# Altium footprint library BARKO_PCBLIB.PcbLib: 531 footprints (part 26 of 34)
Each footprint in its own frame and in the unit in brackets; x right, y up, seen from the top. Pads: shape width x height; smd on the part's side, far side on the other; paste and mask are expansions set on the pad; w line width, h text height; cw(c..) or ccw(c..) is an arc to the next point about the centre after c.
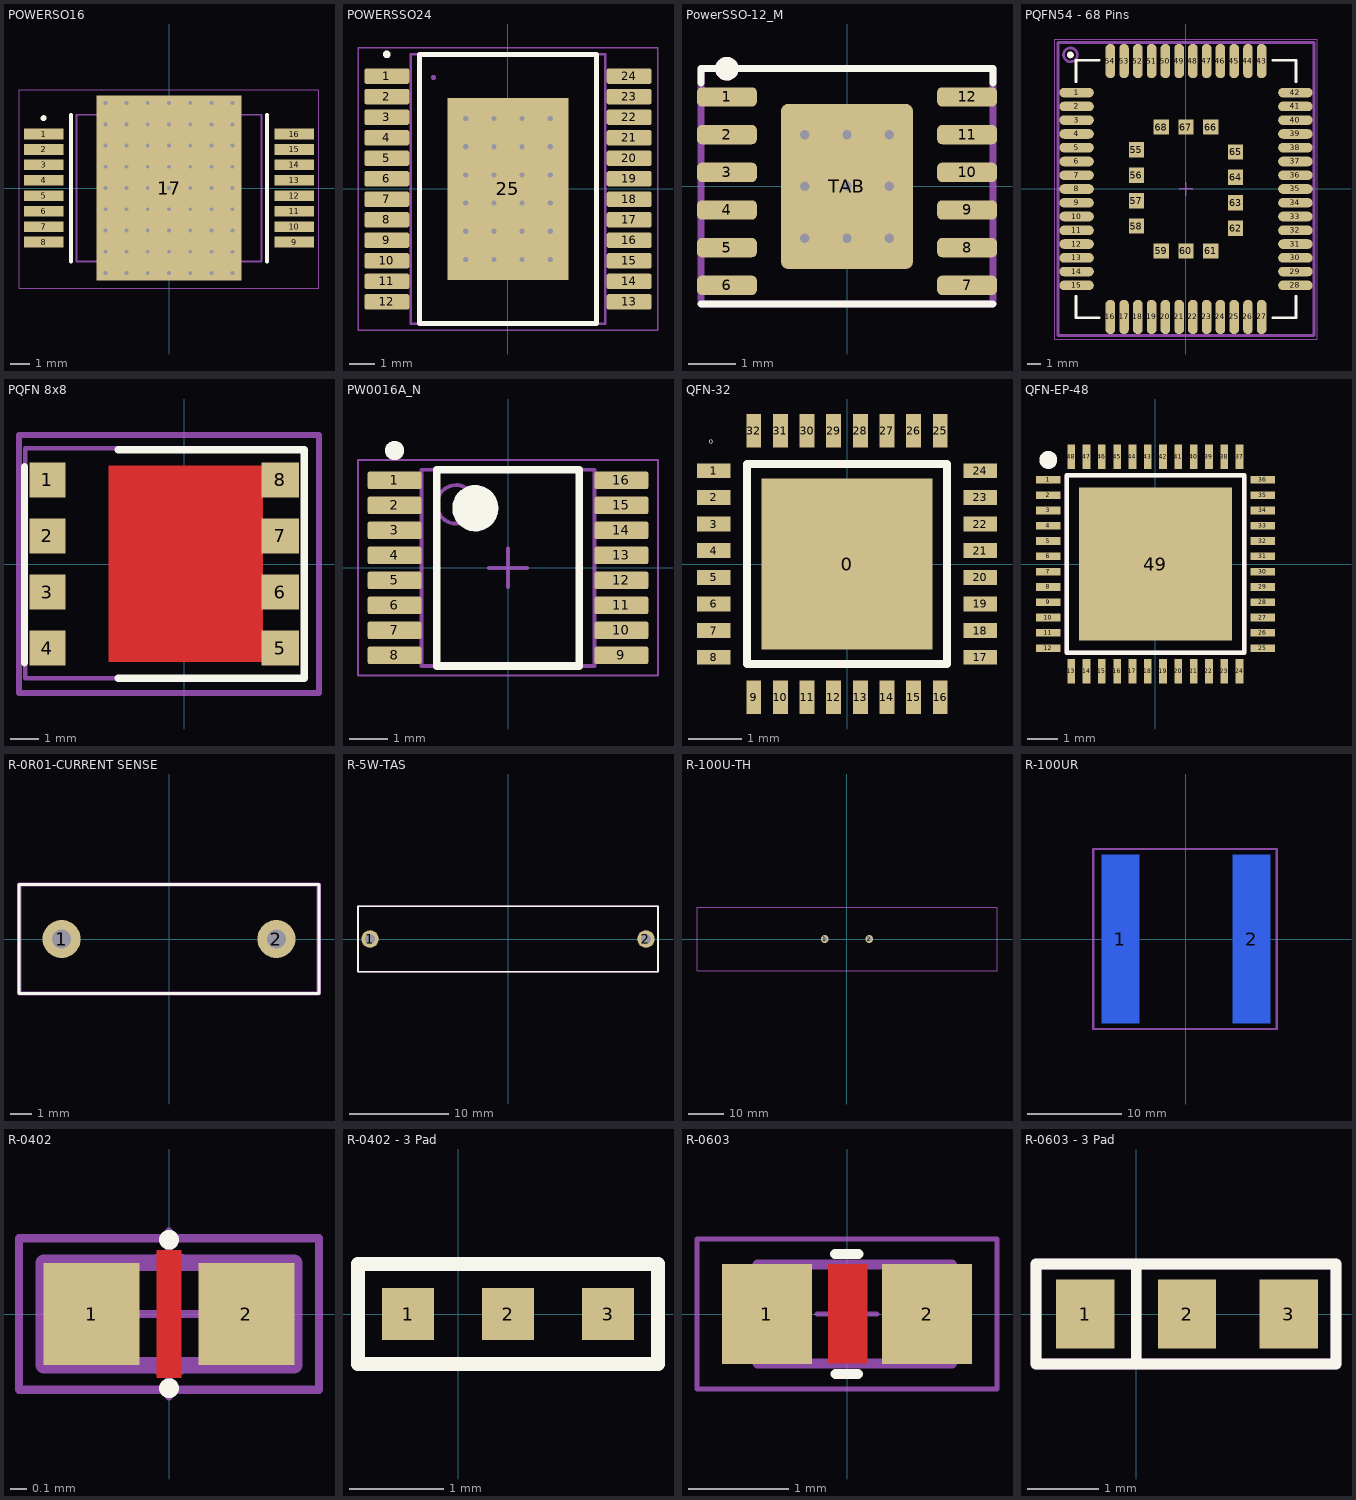
[diagram p25: the footprints below, top view; thin cyan lines are the x and y axes]

## POWERSO16 [mm] "SOP, 16-Leads, Body 7.50x9.45mm, Pitch 0.80mm, Thermal Pad 9.60x7.50mm, IPC Medium Density"
height 3.6
pads (17):
  rect 2.05x0.55 smd mask+0.05: 1(-6.5,2.8) 2(-6.5,2) 3(-6.5,1.2) 4(-6.5,0.4) 5(-6.5,-0.4) 6(-6.5,-1.2) 7(-6.5,-2) 8(-6.5,-2.8) 9(6.5,-2.8) 10(6.5,-2) 11(6.5,-1.2) 12(6.5,-0.4) 13(6.5,0.4) 14(6.5,1.2) 15(6.5,2) 16(6.5,2.8)
  rect 7.5x9.6 smd paste-10 mask+0.05: 17(0,0)
via 3.3,-4.4 diameter 0.5 hole 0.2
via 2.2,-4.4 diameter 0.5 hole 0.2
via 1.1,-4.4 diameter 0.5 hole 0.2
via 0,-4.4 diameter 0.5 hole 0.2
via -1.1,-4.4 diameter 0.5 hole 0.2
via -2.2,-4.4 diameter 0.5 hole 0.2
via -3.3,-4.4 diameter 0.5 hole 0.2
via 3.3,-3.3 diameter 0.5 hole 0.2
via 2.2,-3.3 diameter 0.5 hole 0.2
via 1.1,-3.3 diameter 0.5 hole 0.2
via 0,-3.3 diameter 0.5 hole 0.2
via -1.1,-3.3 diameter 0.5 hole 0.2
via -2.2,-3.3 diameter 0.5 hole 0.2
via -3.3,-3.3 diameter 0.5 hole 0.2
via 3.3,-2.2 diameter 0.5 hole 0.2
via 2.2,-2.2 diameter 0.5 hole 0.2
via 1.1,-2.2 diameter 0.5 hole 0.2
via 0,-2.2 diameter 0.5 hole 0.2
via -1.1,-2.2 diameter 0.5 hole 0.2
via -2.2,-2.2 diameter 0.5 hole 0.2
via -3.3,-2.2 diameter 0.5 hole 0.2
via 3.3,-1.1 diameter 0.5 hole 0.2
via 2.2,-1.1 diameter 0.5 hole 0.2
via 1.1,-1.1 diameter 0.5 hole 0.2
via 0,-1.1 diameter 0.5 hole 0.2
via -1.1,-1.1 diameter 0.5 hole 0.2
via -2.2,-1.1 diameter 0.5 hole 0.2
via -3.3,-1.1 diameter 0.5 hole 0.2
via 3.3,0 diameter 0.5 hole 0.2
via 2.2,0 diameter 0.5 hole 0.2
via 1.1,0 diameter 0.5 hole 0.2
via 0,0 diameter 0.5 hole 0.2
via -1.1,0 diameter 0.5 hole 0.2
via -2.2,0 diameter 0.5 hole 0.2
via -3.3,0 diameter 0.5 hole 0.2
via 3.3,1.1 diameter 0.5 hole 0.2
via 2.2,1.1 diameter 0.5 hole 0.2
via 1.1,1.1 diameter 0.5 hole 0.2
via 0,1.1 diameter 0.5 hole 0.2
via -1.1,1.1 diameter 0.5 hole 0.2
via -2.2,1.1 diameter 0.5 hole 0.2
via -3.3,1.1 diameter 0.5 hole 0.2
via 3.3,2.2 diameter 0.5 hole 0.2
via 2.2,2.2 diameter 0.5 hole 0.2
via 1.1,2.2 diameter 0.5 hole 0.2
via 0,2.2 diameter 0.5 hole 0.2
via -1.1,2.2 diameter 0.5 hole 0.2
via -2.2,2.2 diameter 0.5 hole 0.2
via -3.3,2.2 diameter 0.5 hole 0.2
via 3.3,3.3 diameter 0.5 hole 0.2
via 2.2,3.3 diameter 0.5 hole 0.2
via 1.1,3.3 diameter 0.5 hole 0.2
via 0,3.3 diameter 0.5 hole 0.2
via -1.1,3.3 diameter 0.5 hole 0.2
via -2.2,3.3 diameter 0.5 hole 0.2
via -3.3,3.3 diameter 0.5 hole 0.2
via 3.3,4.4 diameter 0.5 hole 0.2
via 2.2,4.4 diameter 0.5 hole 0.2
via 1.1,4.4 diameter 0.5 hole 0.2
via 0,4.4 diameter 0.5 hole 0.2
via -1.1,4.4 diameter 0.5 hole 0.2
via -2.2,4.4 diameter 0.5 hole 0.2
via -3.3,4.4 diameter 0.5 hole 0.2
Top Overlay:
  circle w0.2: c-6.5,3.625 r0.05
  lines w0.2: -5.075,-3.8 -5.075,3.8 ; 5.075,-3.8 5.075,3.8
Top Paste:
  rectangle: -3.1,3.5 -2.4,4.2
  rectangle: -2,3.5 -1.3,4.2
  rectangle: -0.9,3.5 -0.2,4.2
  rectangle: 0.2,3.5 0.9,4.2
  rectangle: 1.3,3.5 2,4.2
  rectangle: 2.4,3.5 3.1,4.2
  rectangle: 2.4,2.4 3.1,3.1
  rectangle: 1.3,2.4 2,3.1
  rectangle: 0.2,2.4 0.9,3.1
  rectangle: -0.9,2.4 -0.2,3.1
  rectangle: -2,2.4 -1.3,3.1
  rectangle: -3.1,2.4 -2.4,3.1
  rectangle: 2.4,1.3 3.1,2
  rectangle: 1.3,1.3 2,2
  rectangle: 0.2,1.3 0.9,2
  rectangle: -0.9,1.3 -0.2,2
  rectangle: -2,1.3 -1.3,2
  rectangle: -3.1,1.3 -2.4,2
  rectangle: -3.1,-2 -2.4,-1.3
  rectangle: -2,-2 -1.3,-1.3
  rectangle: -0.9,-2 -0.2,-1.3
  rectangle: 0.2,-2 0.9,-1.3
  rectangle: 1.3,-2 2,-1.3
  rectangle: 2.4,-2 3.1,-1.3
  rectangle: -3.1,-0.9 -2.4,-0.2
  rectangle: -2,-0.9 -1.3,-0.2
  rectangle: -0.9,-0.9 -0.2,-0.2
  rectangle: 0.2,-0.9 0.9,-0.2
  rectangle: 1.3,-0.9 2,-0.2
  rectangle: 2.4,-0.9 3.1,-0.2
  rectangle: 2.4,0.2 3.1,0.9
  rectangle: 1.3,0.2 2,0.9
  rectangle: 0.2,0.2 0.9,0.9
  rectangle: -0.9,0.2 -0.2,0.9
  rectangle: -2,0.2 -1.3,0.9
  rectangle: -3.1,0.2 -2.4,0.9
  rectangle: 2.4,-3.1 3.1,-2.4
  rectangle: 1.3,-3.1 2,-2.4
  rectangle: 0.2,-3.1 0.9,-2.4
  rectangle: -0.9,-3.1 -0.2,-2.4
  rectangle: -2,-3.1 -1.3,-2.4
  rectangle: -3.1,-3.1 -2.4,-2.4
  rectangle: 2.4,-4.2 3.1,-3.5
  rectangle: 1.3,-4.2 2,-3.5
  rectangle: 0.2,-4.2 0.9,-3.5
  rectangle: -0.9,-4.2 -0.2,-3.5
  rectangle: -2,-4.2 -1.3,-3.5
  rectangle: -3.1,-4.2 -2.4,-3.5
Mechanical 15:
  lines w0.05: -7.775,-5.2 7.775,-5.2 7.775,5.1 -7.775,5.1 -7.775,-5.2
  lines w0.1: -0.5,0 0.5,0 ; 0,-0.5 0,0.5
ASM Top:
  lines w0.1: -4.8,-3.8 4.8,-3.8 4.8,3.8 -4.8,3.8 -4.8,-3.8
  text ".designator" at -0.344,0 h0.8
3D body "VND5T016ASPTR-E.stp": height 3.6, standoff 0, extent -7.05,-4.75 7.05,4.75

## POWERSSO24 [mm] "SOP, 24-Leads, Body 10.30x7.50mm, Pitch 0.80mm, Thermal Pad 7.10x4.70mm, IPC Medium Density"
height 2.45
pads (25):
  rrect25% 1.75x0.6 smd paste-0.05 mask+0.05: 1(-4.725,4.4) 2(-4.725,3.6) 3(-4.725,2.8) 4(-4.725,2) 5(-4.725,1.2) 6(-4.725,0.4) 7(-4.725,-0.4) 8(-4.725,-1.2) 9(-4.725,-2) 10(-4.725,-2.8) 11(-4.725,-3.6) 12(-4.725,-4.4) 13(4.725,-4.4) 14(4.725,-3.6) 15(4.725,-2.8) 16(4.725,-2) 17(4.725,-1.2) 18(4.725,-0.4) 19(4.725,0.4) 20(4.725,1.2) 21(4.725,2) 22(4.725,2.8) 23(4.725,3.6) 24(4.725,4.4)
  rect 4.7x7.1 smd paste-10 mask+0.05: 25(0,0)
via 1.65,-2.75 diameter 0.5 hole 0.2
via 0.55,-2.75 diameter 0.5 hole 0.2
via -0.55,-2.75 diameter 0.5 hole 0.2
via -1.65,-2.75 diameter 0.5 hole 0.2
via 1.65,-1.65 diameter 0.5 hole 0.2
via 0.55,-1.65 diameter 0.5 hole 0.2
via -0.55,-1.65 diameter 0.5 hole 0.2
via -1.65,-1.65 diameter 0.5 hole 0.2
via 1.65,-0.55 diameter 0.5 hole 0.2
via 0.55,-0.55 diameter 0.5 hole 0.2
via -0.55,-0.55 diameter 0.5 hole 0.2
via -1.65,-0.55 diameter 0.5 hole 0.2
via 1.65,0.55 diameter 0.5 hole 0.2
via 0.55,0.55 diameter 0.5 hole 0.2
via -0.55,0.55 diameter 0.5 hole 0.2
via -1.65,0.55 diameter 0.5 hole 0.2
via 1.65,1.65 diameter 0.5 hole 0.2
via 0.55,1.65 diameter 0.5 hole 0.2
via -0.55,1.65 diameter 0.5 hole 0.2
via -1.65,1.65 diameter 0.5 hole 0.2
via 1.65,2.75 diameter 0.5 hole 0.2
via 0.55,2.75 diameter 0.5 hole 0.2
via -0.55,2.75 diameter 0.5 hole 0.2
via -1.65,2.75 diameter 0.5 hole 0.2
Top Overlay:
  circle w0.25: c-4.725,5.25 r0.025
  lines w0.2: -3.45,-5.25 3.45,-5.25 3.45,5.25 -3.45,5.25 -3.45,-5.25
Top Paste:
  region: -1.9,-2.6 -1.9,-1.9 -2.3,-1.9 -2.3,-2.6
  region: 2.3,-2.6 2.3,-1.9 1.9,-1.9 1.9,-2.6
  rectangle: -0.4,-3.4 0.3,-3
  rectangle: 0.7,-3.4 1.4,-3
  rectangle: -1.5,-3.4 -0.8,-3
  region: -2.3,-0.75 -2.3,-1.45 -1.9,-1.45 -1.9,-0.75
  region: -2.3,0.35 -2.3,-0.35 -1.9,-0.35 -1.9,0.35
  region: -2.3,1.45 -2.3,0.75 -1.9,0.75 -1.9,1.45
  region: -2.3,2.55 -2.3,1.85 -1.9,1.85 -1.9,2.55
  region: -2.3,2.55 -2.3,1.85 -1.9,1.85 -1.9,2.55
  region: 1.9,-0.75 1.9,-1.45 2.3,-1.45 2.3,-0.75
  region: 1.9,0.35 1.9,-0.35 2.3,-0.35 2.3,0.35
  region: 1.9,2.55 1.9,1.85 2.3,1.85 2.3,2.55
  region: 1.9,1.45 1.9,0.75 2.3,0.75 2.3,1.45
  rectangle: -1.5,3 -0.8,3.4
  rectangle: 0.7,3 1.4,3.4
  rectangle: -0.4,3 0.3,3.4
  rectangle: -1.5,-2.5 -0.8,-1.9
  rectangle: -0.4,-2.5 0.3,-1.9
  rectangle: 0.7,-2.5 1.4,-1.9
  rectangle: -1.5,-1.4 -0.8,-0.8
  rectangle: -0.4,-1.4 0.3,-0.8
  rectangle: 0.7,-1.4 1.4,-0.8
  rectangle: -1.5,-0.3 -0.8,0.3
  rectangle: -0.4,-0.3 0.3,0.3
  rectangle: 0.7,-0.3 1.4,0.3
  rectangle: -1.5,0.8 -0.8,1.4
  rectangle: -0.4,0.8 0.3,1.4
  rectangle: 0.7,0.8 1.4,1.4
  rectangle: 0.7,1.9 1.4,2.5
  rectangle: -0.4,1.9 0.3,2.5
  rectangle: -1.5,1.9 -0.8,2.5
Mechanical 15:
  lines w0.05: -5.85,-5.5 5.85,-5.5 5.85,5.5 -5.85,5.5 -5.85,-5.5
  lines w0.1: -0.5,0 0.5,0 ; 0,-0.5 0,0.5
ASM Top:
  circle w0.1: c-2.9,4.35 r0.05
  lines w0.1: -3.8,-5.25 -3.8,5.25 3.8,5.25 3.8,-5.25 -3.8,-5.25
3D body: height 2.45, standoff 0.1, extent -3.8,-5.25 3.8,5.25

## PowerSSO-12_M [mm] "SOP, 10-Leads, Body 7.5x9.4mm, Pitch 1.27mm, Thermal Pad, IPC Low Density"
height 3.7
pads (13):
  rrect50% 1.27x0.41 smd mask+0.05: 1(-2.55,1.9) 2(-2.55,1.1) 3(-2.55,0.3) 4(-2.55,-0.5) 5(-2.55,-1.3) 6(-2.55,-2.1) 7(2.55,-2.1) 8(2.55,-1.3) 9(2.55,-0.5) 10(2.55,0.3) 11(2.55,1.1) 12(2.55,1.9)
  rrect10% 2.8x3.5 smd paste-3.15 mask+0.05: TAB(0,0)
via 0,0 diameter 0.5 hole 0.2
via 0.9,0 diameter 0.5 hole 0.2
via -0.9,0 diameter 0.5 hole 0.2
via -0.9,1.1 diameter 0.5 hole 0.2
via 0.9,1.1 diameter 0.5 hole 0.2
via -0.9,-1.1 diameter 0.5 hole 0.2
via 0,-1.1 diameter 0.5 hole 0.2
via 0.9,-1.1 diameter 0.5 hole 0.2
via 0,1.1 diameter 0.5 hole 0.2
Top Overlay:
  circle w0.25: c-2.55,2.5 r0.125
  lines w0.15: -3.1,-2.5 3.1,-2.5 ; -3.1,2.2 -3.1,2.5 ; -2,2.5 -3.1,2.5 ; -2,2.5 3.1,2.5 3.1,2.5 3.1,2.2 ; -3.1,2.5 -3.1,2.5
Top Paste:
  region: 1.1,-1.55 1.1,-0.6 0.15,-0.6 0.15,-1.55
  region: -0.15,-1.55 -0.15,-0.6 -1.1,-0.6 -1.1,-1.55
  region: -0.15,0.55 -0.15,1.5 -1.1,1.5 -1.1,0.55
  rectangle: 0.15,0.55 1.1,1.5
ASM Top:
  circle w0.25: c-2.55,2.5 r0.125
  lines w0.15: -3.1,-2.5 -3.1,2.5 3.1,2.5 ; -3.1,-2.5 -3.1,-2.5 ; -3.1,-2.5 3.1,-2.5 3.1,2.5 ; 3.1,2.5 3.1,2.5
  text ".designator" at 0,0 h0.8
3D body "User Library-ST_MICRO_PowerSSO-12.step": height 1.65, standoff 0.01, extent -3.1,-2.5 3.1,2.5

## PQFN54 - 68 Pins [mm] "PQFN, 54-Leads, Body 18.60x21.30mm, Pitch 1.00mm, IPC Medium Density"
height 3
pads (68):
  oval 2.5x0.7 smd paste-0.05 mask+0.05: 1(-7.95,7) 2(-7.95,6) 3(-7.95,5) 4(-7.95,4) 5(-7.95,3) 6(-7.95,2) 7(-7.95,1) 8(-7.95,0) 9(-7.95,-1) 10(-7.95,-2) 11(-7.95,-3) 12(-7.95,-4) 13(-7.95,-5) 14(-7.95,-6) 15(-7.95,-7) 28(7.95,-7) 29(7.95,-6) 30(7.95,-5) 31(7.95,-4) 32(7.95,-3) 33(7.95,-2) 34(7.95,-1) 35(7.95,0) 36(7.95,1) 37(7.95,2) 38(7.95,3) 39(7.95,4) 40(7.95,5) 41(7.95,6) 42(7.95,7)
  oval 0.7x2.5 smd paste-0.05 mask+0.05: 16(-5.5,-9.3) 17(-4.5,-9.3) 18(-3.5,-9.3) 19(-2.5,-9.3) 20(-1.5,-9.3) 21(-0.5,-9.3) 22(0.5,-9.3) 23(1.5,-9.3) 24(2.5,-9.3) 25(3.5,-9.3) 26(4.5,-9.3) 27(5.5,-9.3) 43(5.5,9.3) 44(4.5,9.3) 45(3.5,9.3) 46(2.5,9.3) 47(1.5,9.3) 48(0.5,9.3) 49(-0.5,9.3) 50(-1.5,9.3) 51(-2.5,9.3) 52(-3.5,9.3) 53(-4.5,9.3) 54(-5.5,9.3)
  rect 1.1x1.1 smd paste-0.05 mask+0.05: 55(-3.6,2.85) 56(-3.6,1) 57(-3.6,-0.85) 58(-3.6,-2.7) 59(-1.8,-4.5) 60(0,-4.5) 61(1.8,-4.5) 62(3.6,-2.85) 63(3.6,-1) 64(3.6,0.85) 65(3.6,2.7) 66(1.8,4.5) 67(0,4.5) 68(-1.8,4.5)
Top Overlay:
  circle w0.25: c-8.4,9.75 r0.125
  lines w0.2: -8.001,-7.8 -8.001,-9.351 -6.3,-9.351 ; -8.001,7.8 -8.001,9.351 -6.3,9.351 ; 6.3,-9.351 8.001,-9.351 8.001,-7.8 ; 6.3,9.351 8.001,9.351 8.001,7.8
Mechanical 15:
  lines w0.05: -9.55,-10.9 9.55,-10.9 9.55,10.9 -9.55,10.9 -9.55,-10.9
  lines w0.1: -0.5,0 0.5,0 ; 0,-0.5 0,0.5
ASM Top:
  circle w0.2: c-8.4,9.75 r0.5
  lines w0.2: -9.3,-10.65 -9.3,10.65 9.3,10.65 9.3,-10.65 -9.3,-10.65
  text ".designator" at -1.5,-0.3 h0.8
3D body "User Library-Quectel MC60.step": height 2.11, standoff 0.01, extent -8.001,-9.351 8.001,9.351

## PQFN 8x8 [mm]
pads (8):
  rect 1.28x1.25 smd mask+0: 1(-4.89,3) 2(-4.89,1) 3(-4.89,-1) 4(-4.89,-3)
  rect 1.33x1.25 smd mask+0: 5(3.415,-3) 6(3.415,-1) 7(3.415,1) 8(3.415,3)
Top Layer:
  rectangle: -2.7,-3.49 2.8,3.51
Top Overlay:
  lines w0.254: -5.7,-3.525 -5.7,3.475 ; -2.375,-4.075 4.275,-4.075 ; -2.375,4.075 4.275,4.075 ; 4.275,-4.05 4.275,4.05
Top Paste:
  rectangle: 1.075,-3.2 2.55,-1.375
  rectangle: -0.725,-3.2 0.75,-1.375
  rectangle: -2.525,-3.2 -1.05,-1.375
  rectangle: 1.075,-0.913 2.55,0.913
  rectangle: -0.725,-0.913 0.75,0.913
  rectangle: -2.525,-0.913 -1.05,0.913
  rectangle: 1.075,1.4 2.55,3.225
  rectangle: -0.725,1.4 0.75,3.225
  rectangle: -2.525,1.4 -1.05,3.225
Mechanical 15:
  lines w0.2: -5.9,-4.6 -5.9,4.6 4.8,4.6 4.8,-4.6 -5.9,-4.6
ASM Top:
  lines w0.15: -5.675,-4.075 4.2,-4.075 4.225,-4.05 4.225,4.125 -5.675,4.125 -5.675,-4.075
  text ".designator" at 0,0 h1.2
3D body: height 2, standoff 0, extent -5.328,-4.075 3.629,4.125

## PW0016A_N [mm] "SOP, 16-Leads, Body 5.1x4.5mm, Pitch 0.65mm, IPC Medium Density"
height 1.2
pads (16):
  rrect22% 1.4x0.45 smd: 1(-2.95,2.275) 2(-2.95,1.625) 3(-2.95,0.975) 4(-2.95,0.325) 5(-2.95,-0.325) 6(-2.95,-0.975) 7(-2.95,-1.625) 8(-2.95,-2.275) 9(2.95,-2.275) 10(2.95,-1.625) 11(2.95,-0.975) 12(2.95,-0.325) 13(2.95,0.325) 14(2.95,0.975) 15(2.95,1.625) 16(2.95,2.275)
Top Overlay:
  circle w0.25: c-2.95,3.05 r0.125
  circle w0.6: c-0.85,1.55 r0.3
  lines w0.2: -1.85,-2.55 -1.85,2.55 1.85,2.55 1.85,-2.55 -1.85,-2.55
Top 3D Body:
  text ".Designator" at -1.524,-0.508 h1.02
Mechanical 13:
  circle w0.1: c-1.35,1.65 r0.5
  lines w0.1: -2.25,-2.55 -2.25,2.55 2.25,2.55 2.25,-2.55 -2.25,-2.55
Mechanical 15:
  lines w0.05: -3.9,-2.8 -3.9,2.8 3.9,2.8 3.9,-2.8 -3.9,-2.8
  lines w0.1: -0.5,0 0.5,0 ; 0,-0.5 0,0.5
3D body "PW0016AakaMTC16.stp": height 1, standoff 0, extent -3.21,-2.5 3.21,2.5

## QFN-32 [mm]
pads (33):
  rect 3.2x3.2 smd paste-100 mask+0: 0(0,0)
  rect 0.63x0.28 smd mask+0.051: 1(-2.5,1.75) 2(-2.5,1.25) 3(-2.5,0.75) 4(-2.5,0.25) 5(-2.5,-0.25) 6(-2.5,-0.75) 7(-2.5,-1.25) 8(-2.5,-1.75) 17(2.5,-1.75) 18(2.5,-1.25) 19(2.5,-0.75) 20(2.5,-0.25) 21(2.5,0.25) 22(2.5,0.75) 23(2.5,1.25) 24(2.5,1.75)
  rect 0.28x0.63 smd mask+0.051: 9(-1.75,-2.5) 10(-1.25,-2.5) 11(-0.75,-2.5) 12(-0.25,-2.5) 13(0.25,-2.5) 14(0.75,-2.5) 15(1.25,-2.5) 16(1.75,-2.5) 25(1.75,2.5) 26(1.25,2.5) 27(0.75,2.5) 28(0.25,2.5) 29(-0.25,2.5) 30(-0.75,2.5) 31(-1.25,2.5) 32(-1.75,2.5)
Top Overlay:
  lines w0.152: -1.88,-1.88 -1.88,1.88 1.88,1.88 1.88,-1.88 -1.88,-1.88
  text "o" at -2.591,2.261 h0.1
3D body "QFN32-1.STEP": height 0.94, standoff 0.01, extent -2.515,-2.489 2.486,2.511

## QFN-EP-48 [mm]
pads (49):
  rect 0.8x0.25 smd mask+0.051: 1(-3.5,2.75) 2(-3.5,2.25) 3(-3.5,1.75) 4(-3.5,1.25) 5(-3.5,0.75) 6(-3.5,0.25) 7(-3.5,-0.25) 8(-3.5,-0.75) 9(-3.5,-1.25) 10(-3.5,-1.75) 11(-3.5,-2.25) 12(-3.5,-2.75) 25(3.5,-2.75) 26(3.5,-2.25) 27(3.5,-1.75) 28(3.5,-1.25) 29(3.5,-0.75) 30(3.5,-0.25) 31(3.5,0.25) 32(3.5,0.75) 33(3.5,1.25) 34(3.5,1.75) 35(3.5,2.25) 36(3.5,2.75)
  rect 0.25x0.8 smd mask+0.051: 13(-2.75,-3.5) 14(-2.25,-3.5) 15(-1.75,-3.5) 16(-1.25,-3.5) 17(-0.75,-3.5) 18(-0.25,-3.5) 19(0.25,-3.5) 20(0.75,-3.5) 21(1.25,-3.5) 22(1.75,-3.5) 23(2.25,-3.5) 24(2.75,-3.5) 37(2.75,3.5) 38(2.25,3.5) 39(1.75,3.5) 40(1.25,3.5) 41(0.75,3.5) 42(0.25,3.5) 43(-0.25,3.5) 44(-0.75,3.5) 45(-1.25,3.5) 46(-1.75,3.5) 47(-2.25,3.5) 48(-2.75,3.5)
  rect 5x5 smd paste-5.08: 49(0,0)
Top Overlay:
  circle w0.305: c-3.5,3.4 r0.141
  lines w0.152: -2.9,-2.9 2.9,-2.9 2.9,2.9 -2.9,2.9 -2.9,-2.9
Top Paste:
  region: 5.9,-0.2
  region: -0.568,2.349 0.579,2.349 0.579,1.213 -0.568,1.213
  region: -2.337,2.349 -1.2,2.349 -1.2,1.2 -2.337,1.2
  region: 1.2,2.349 2.324,2.349 2.324,1.213 1.2,1.213
  region: 1.2,0.541 2.324,0.541 2.324,-0.568 1.2,-0.568
  region: -0.575,0.567 0.548,0.567 0.548,-0.568 -0.575,-0.568
  region: -2.35,0.535 -1.2,0.535 -1.2,-0.575 -2.349,-0.575
  region: -2.35,-1.2 -1.2,-1.2 -1.2,-2.35 -2.349,-2.349
  region: -0.561,-1.213 0.561,-1.213 0.561,-2.35 -0.561,-2.349
  region: 1.2,-1.225 2.324,-1.225 2.324,-2.349 1.2,-2.35
ASM Top:
  lines w0.152: -2.9,-2.9 2.9,-2.9 2.9,2.9 -2.9,2.9 -2.9,-2.9
  text ".designator" at -1.905,-0.762 h0.8
3D body "QFN_48.STEP": height 1.11, standoff 0.01, extent -3.495,-3.505 3.505,3.495

## R-0R01-CURRENT SENSE [mil]
pads (2):
  round 70 hole 35: 1(-196.85,0) 2(196.85,0)
Top Overlay:
  lines w6: -275,-100 -275,100 275,100 275,-100 -275,-100
ASM Top:
  lines w7.87: -274.37,-99.47 -273.84,-100 274.47,-100 274.47,100 -274.37,100 -274.37,-99.47
  text ".designator" at -32,-7 h31.5
3D body "RADIAL-CURRENTSENSE.STEP": height 989.29, standoff -132.76, extent -275.59,-100 275.59,96.85

## R-5W-TAS [mil]
pads (2):
  round 70 hole 40: 1(-550,0) 2(550,0)
Top Overlay:
  lines w6: -598,-131 -598,131 598,131 598,-131 -598,-131
ASM Top:
  lines w6: -598,-131 598,-131 598,131 -598,131 -598,-131
  text ".designator" at -287,-22 h31.5
3D body "RES-5W.STEP": height 354.72, standoff -118.11, extent -567,-119.11 564.49,117.11

## R-100U-TH [mm]
pads (2):
  round 2.2 hole 1.4: 1(-6.26,0) 2(6.34,0)
ASM Top:
  lines w0.2: 42.534,8.993 -42.454,8.993 -42.454,-8.99 -42.454,-8.99 42.534,-8.99 42.534,8.993 ; 42.534,8.993 42.534,8.993
  text ".designator" at 0,0 h0.8
3D body "WSBS8518-20-60_100u.STEP": height 4.81, standoff -6.19, extent -42.454,-8.99 42.534,8.993

## R-100UR [mm]
pads (2):
  rect 4x18 smd far side: 1(-7,0) 2(7,0)
Bottom Overlay:
  lines w0.254: -9.903,-9.6 -9.903,9.6 9.697,9.6 9.697,-9.6 -9.903,-9.6
ASM Top:
  lines w0.254: -9.9,-9.6 -9.9,9.6 9.7,9.6 9.7,-9.6 -9.9,-9.6
  text ".designator" at -1.092,-0.203 h0.8
3D body "100uR sont.STEP": height -1.6, standoff -4.6, extent -42.545,-9.068 42.443,8.915

## R-0402 [mm]
pads (2):
  rect 0.58x0.62 smd: 1(-0.47,0) 2(0.47,0)
Top Layer:
  pour cut-out: -0.075,0.388 -0.075,-0.387 0.075,-0.387 0.075,0.388
Top Overlay:
  circle w0.1: c0,-0.45 r0.01
  circle w0.1: c0,0.45 r0.01
Mechanical 15:
  circle w0.05: c0,0 r0.35
  lines w0.05: -0.5,0 0.5,0 ; 0,-0.5 0,0.5 ; -0.91,-0.46 0.91,-0.46 0.91,0.46 -0.91,0.46 -0.91,-0.46
ASM Top:
  lines w0.1: -0.76,-0.31 0.76,-0.31 0.76,0.31 -0.76,0.31 -0.76,-0.31
  text ".designator" at -0.011,-0.078 h0.8
3D body "R_0402-son.STEP": height 0.36, standoff 0.01, extent -0.5,-0.25 0.5,0.25

## R-0402 - 3 Pad [mil]
pads (3):
  rect 22x22 smd: 1(-21,0) 2(21,0) 3(63,0)
Top Overlay:
  lines w6: -42,-21 84,-21 84,21 -42,21 -42,-21
ASM Top:
  lines w6: -42,-21 -42,21 84,21 84,-21 -42,-21
  text ".designator" at -28,-7 h31.5
3D body "R_0402-son.STEP": height 14.28, standoff 0.5, extent -22.37,-10 17,9.69

## R-0603 [mm]
pads (2):
  rect 0.9x1 smd: 1(-0.8,0) 2(0.8,0)
Top Layer:
  pour cut-out: -0.189,0.495 -0.189,-0.495 0.201,-0.495 0.201,0.495
Top Overlay:
  lines w0.1: -0.118,0.6 0.113,0.6 ; -0.116,-0.6 0.112,-0.6
Mechanical 15:
  lines w0.05: -0.3,0 0.3,0 ; 0,-0.3 0,0.3 ; -1.5,-0.75 -1.5,0.75 1.5,0.75 1.5,-0.75 -1.5,-0.75
ASM Top:
  lines w0.1: -0.893,-0.495 1.05,-0.495 1.05,0.495 -0.893,0.495 -0.893,-0.495
  text ".designator" at -0.394,-0.2 h0.8
3D body: height 0.25, standoff 0, extent 0.025,0.229 0.025,0.229
3D body "User Library-RES_1609-0603.STEP": height 0.57, standoff 0.01, extent -0.85,-0.4 0.85,0.4

## R-0603 - 3 Pad [mil]
pads (3):
  rect 32x38 smd mask+1.97: 1(-28,0) 2(28,0) 3(84,0)
Top Overlay:
  lines w5.91: 0,-27.56 0.1,27.56
  lines w6: -55.12,-27.56 -55.12,27.56 110,27.56 110,-27.56 -55.12,-27.56
ASM Top:
  lines w5.91: 0,-27.56 0.1,27.56
  lines w6: -55.12,-27.56 110,-27.56 110,27.56 -55.12,27.56 -55.12,-27.56
  text ".designator" at -40,-15 h31.5
3D body: height 10, standoff 0, extent 1,9 1,9
3D body "User Library-RES_1609-0603.STEP": height 22.55, standoff 0.5, extent -33.47,-16 33.47,15.49